# Altium schematic symbol library BARKO_SCHLIB.SchLib: 1064 symbols (part 10 of 11) (continued)
## R-69K8-0805 (continued)
RES 69.8K OHM 1% 1/8W 0805; Manufacturer 1: Stackpole Electronics; Manufacturer Part Number: RMCF0805FT69K8; Resistance: 69.8kR; Max Power Dissipation: 125mW; Temperature Coefficient: 100ppm/°C; .Creator: M.OZKAN; .PCBCHK: USED; Supplier 1: Digi-Key; Supplier Part Number 1: RMCF0805FT69K8CT-ND; RoHS: Yes; Category: Chip SMD Resistors; Stock: 4635; Pricing: 1=0,10000, 10=0,02600, 100=0,01040, 1000=0,00466, 2500=0,00405 (USD); Mount: Surface Mount; Case Code (Metric): 2012; Case Code (Imperial): 0805; Contact Plating: Tin,Matte; Min Operating Temperature: -55°C; Max Operating Temperature: 155°C; Features: Automotive AEC-Q200; Tolerance: 1%; Composition: Thick Film; Number of Terminations: 2; Packaging: Tape and Reel; Length: 0.079inch; Height: 0.026inch; Width: 0.049inch; Radiation Hardening: No; ComponentLink1URL: https://www.seielect.com/catalog/SEI-RMCF_RMCP.pdf?src-supplier=Avnet; ComponentLink1Description: https://www.seielect.com/catalog/SEI-RMCF_RMCP.pdf?src-supplier=Avnet; ComponentLink2URL: https://www.seielect.com/catalog/SEI-Packaging.pdf?src-supplier=Digi-Key; ComponentLink2Description: https://www.seielect.com/catalog/SEI-Packaging.pdf?src-supplier=Digi-Key; ComponentLink3URL: https://www.seielect.com/Catalog/SEI-RMCF_RMCP.pdf?src-supplier=Digi-Key; ComponentLink3Description: https://www.seielect.com/Catalog/SEI-RMCF_RMCP.pdf?src-supplier=Digi-Key; .SCHCHK: USED
footprint R-0805
pins: 1, 2

## R-75K-0603
designator R?, comment 75K  Case/Package: 0603
RES 100K OHM 1% 1/10W 0603; Manufacturer: Stackpole Electronics; Manufacturer Part Number: RMCF0603FT100K; Resistance: 100kR; Temperature Coefficient: 100ppm/°C; Max Power Dissipation: 100mW; Working Voltage: 75V; Washability: OK; .Creator: M.OZKAN; .PCBCHK: USED; Supplier 1: Digi-Key; Supplier Part Number 1: RMCF0603FT100KCT-ND; Stock 1: 1975649; Pricing 1: 1=0.10000, 10=0.01600, 100=0.00650, 1000=0.00292, 2500=0.00253 (USD); RoHS: Yes; Mount: Surface Mount; Case Code (Metric): 1608; Contact Plating: Tin,Matte; Case Code (Imperial): 0603; Min Operating Temperature: -55°C; Max Operating Temperature: 155°C; Tolerance: 1%; Packaging: Tape and Reel; Composition: Thick Film; Number of Terminations: 2; Features: Automotive AEC-Q200; Military Standard: Not; Power Rating: 100mW; Length: 1.55mm; Height: 0.022inch; Width: 0.031inch; Depth: 0.8mm; Radiation Hardening: No; Lead Free: Lead Free; ComponentLink1URL: https://datasheet.ciiva.com/15193/getdatasheetpartid-362597-15193437.pdf?src-supplier=Verical; ComponentLink1Description: https://datasheet.ciiva.com/15193/getdatasheetpartid-362597-15193437.pdf?src-supplier=Verical; .SCHCHK: USED
footprint R-0603
pins: 1, 2

## R-75R-0402
designator R?, comment 75R  Case Code (Imperial): 0402
RES SMD 75 OHM 1% 1/10W 0402; Manufacturer: Panasonic; Manufacturer Part Number: ERJ-2RKF75R0X; Voltage Rating: 50V; Power Rating: 100mW; Temperature Coefficient: 100ppm/°C; .PCBCHK: USED; .Creator: F:TALI; Washability: OK; Stock 1: 2772559; Pricing 1: 1=0.1, 10=0.045, 100=0.0183, 1000=0.00823, 2500=0.00715, 5000=0.0059 (USD); Mount: Surface Mount; Case/Package: 0402; Case Code (Metric): 1005; Contact Plating: Tin; Min Operating Temperature: -55°C; Max Operating Temperature: 155°C; Tolerance: 1%; Packaging: Tape and Reel; Resistance: 75R; Package Quantity: 1; Composition: Thick Film; Number of Terminations: 2; Termination: SMD/SMT; Military Standard: Not; Max Power Dissipation: 100mW; Voltage Rating (DC): 50V; Features: Automotive AEC-Q200; Length: 1mm; Height: 0.35mm; Width: 0.02inch; Depth: 0.5mm; Radiation Hardening: No; REACH SVHC: No SVHC; Lead Free: Lead Free; ComponentLink1URL: https://industrial.panasonic.com/cdbs/www-data/pdf/RDA0000/DMA0000COL11.pdf; ComponentLink1Description: https://industrial.panasonic.com/cdbs/www-data/pdf/RDA0000/DMA0000COL11.pdf; ComponentLink2URL: http://www.farnell.com/datasheets/1911175.pdf; ComponentLink2Description: http://www.farnell.com/datasheets/1911175.pdf; ComponentLink3URL: http://www.alliedelec.com/m/d/623f45ff1957d936ff56d46fd1c28cac.pdf; ComponentLink3Description: http://www.alliedelec.com/m/d/623f45ff1957d936ff56d46fd1c28cac.pdf; ComponentLink4URL: http://industrial.panasonic.com/www-data/pdf/AOA0000/AOA0000CE2.pdf; ComponentLink4Description: http://industrial.panasonic.com/www-data/pdf/AOA0000/AOA0000CE2.pdf; ComponentLink5URL: http://www.mouser.com/ds/2/315/AOA0000CE2-37512.pdf; ComponentLink5Description: http://www.mouser.com/ds/2/315/AOA0000CE2-37512.pdf; ComponentLink6URL: http://www.farnell.com/datasheets/426256.pdf; ComponentLink6Description: http://www.farnell.com/datasheets/426256.pdf; Stock 2: 926909; Pricing 2: 1=0.1, 10=0.031, 100=0.0125, 1000=0.0056, 2500=0.00486, 5000=0.00401 (USD); ComponentLink7URL: http://www.farnell.com/datasheets/2059623.pdf; ComponentLink7Description: http://www.farnell.com/datasheets/2059623.pdf; ComponentLink8URL: http://industrial.panasonic.com/www-data/pdf/AOA0000/AOA0000CE1.pdf; ComponentLink8Description: http://industrial.panasonic.com/www-data/pdf/AOA0000/AOA0000CE1.pdf; ComponentLink9URL: http://www.alliedelec.com/m/d/51cd0790071e1666bdb9d00c57fcf960.pdf; ComponentLink9Description: http://www.alliedelec.com/m/d/51cd0790071e1666bdb9d00c57fcf960.pdf; ComponentLink10URL: http://www.mouser.com/ds/2/315/AOA0000C84-947596.pdf; ComponentLink10Description: http://www.mouser.com/ds/2/315/AOA0000C84-947596.pdf; ComponentLink11URL: https://www.alliedelec.com/m/d/51cd0790071e1666bdb9d00c57fcf960.pdf; ComponentLink11Description: https://www.alliedelec.com/m/d/51cd0790071e1666bdb9d00c57fcf960.pdf; ComponentLink12URL: http://www.farnell.com/datasheets/1500035.pdf; ComponentLink12Description: http://www.farnell.com/datasheets/1500035.pdf; ComponentLink13URL: http://www.farnell.com/datasheets/1678796.pdf; ComponentLink13Description: http://www.farnell.com/datasheets/1678796.pdf; Stock 3: 153680; Pricing 3: 1=0.1, 10=0.016, 100=0.0064, 1000=0.00289, 2500=0.0025, 5000=0.00207 (USD); .SCHCHK: USED; Supplier 1: Digi-Key; Supplier Part Number 1: RMCF0402FT75R0DKR-ND
footprint R-0402
pins: 1, 2

## R-75R-0603
designator R?, comment 75R  Case Code (Imperial): 0603
RES SMD 75 OHM 1% 1/10W 0603; Manufacturer: Stackpole Electronics; Manufacturer Part Number: RMCF0603FT75R0; Max Power Dissipation: 100mW; Temperature Coefficient: 100ppm/°C; Washability: OK; .Creator: M.OZKAN; .PCBCHK: USED; Supplier 1: Digi-Key; Stock 1: 169664; Pricing 1: 1=0,10000, 10=0,01600, 100=0,00650, 1000=0,00292, 2500=0,00253 (USD); RoHS: Yes; Mount: Surface Mount; Case/Package: 0603; Case Code (Metric): 1608; Contact Plating: Tin,Matte; Min Operating Temperature: -55°C; Max Operating Temperature: 155°C; Packaging: Tape and Reel; Resistance: 75R; Tolerance: 1%; Composition: Thick Film; Number of Terminations: 2; Military Standard: Not; Features: Automotive AEC-Q200; Length: 0.061inch; Height: 0.022inch; Width: 0.031inch; Depth: 0.8mm; Radiation Hardening: No; ComponentLink1URL: https://datasheet.ciiva.com/15193/getdatasheetpartid-701591-15193493.pdf?src-supplier=Verical; ComponentLink1Description: https://datasheet.ciiva.com/15193/getdatasheetpartid-701591-15193493.pdf?src-supplier=Verical; Supplier Part Number 1: RMCF0603FT75R0CT-ND; .SCHCHK: USED
footprint R-0603
pins: 1, 2

## R-75R-0805
designator R?, comment 75R  Case/Package: 0805
RES SMD 75 OHM 1% 1/4W 0805; Manufacturer 1: Stackpole Electronics; Manufacturer Part Number: RNCP0805FTD75R0; Max Power Dissipation: 250mW; Temperature Coefficient: 100ppm/°C; .Creator: M.OZKAN; .PCBCHK: USED; Supplier 1: Digi-Key; RoHS: Yes; Category: Chip SMD Resistors; Stock: 48059; Pricing: 1=0,10000, 10=0,06900, 100=0,02640, 1000=0,01162, 2500=0,01003 (USD); Mount: Surface Mount; Case Code (Metric): 2012; Case Code (Imperial): 0805; Min Operating Temperature: -55°C; Max Operating Temperature: 155°C; Packaging: Tape and Reel; Composition: Thin Film; Number of Terminations: 2; Resistance: 75R; Features: Moisture Resistant,Anti-Sulfur; Tolerance: 1%; Length: 0.079inch; Height: 0.024inch; Width: 0.049inch; ComponentLink1URL: https://www.seielect.com/catalog/SEI-Packaging.pdf?src-supplier=Digi-Key; ComponentLink1Description: https://www.seielect.com/catalog/SEI-Packaging.pdf?src-supplier=Digi-Key; ComponentLink2URL: http://www.seielect.com/Catalog/SEI-rncp.pdf?src-supplier=Digi-Key; ComponentLink2Description: http://www.seielect.com/Catalog/SEI-rncp.pdf?src-supplier=Digi-Key; Supplier Part Number 1: RNCP0805FTD75R0CT-ND; .SCHCHK: USED
footprint R-0805
pins: 1, 2

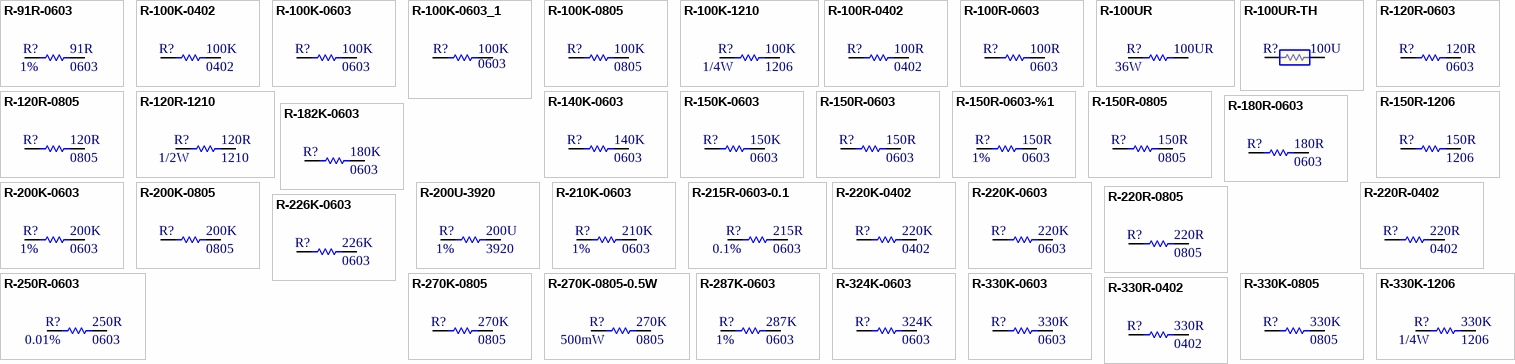
[diagram p39: symbols R-91R-0603 to R-330R-0402]

## R-91R-0603
designator R?, comment 91R  Tolerance: 1%  Case/Package: 0603
RES SMD 91 OHM 1% 1/10W 0603; Manufacturer: Yageo; Manufacturer Part Number: RC0603FR-0791RL; Power Rating: 100mW; Voltage Rating: 50V; Temperature Coefficient: 100ppm/°C; Washability: OK; .Creator: M.OZKAN; .PCBCHK: USED; ComponentLink1URL: https://www.seielect.com/Catalog/SEI-RMCF_RMCP.pdf?src-supplier=Digi-Key; ComponentLink1Description: https://www.seielect.com/Catalog/SEI-RMCF_RMCP.pdf?src-supplier=Digi-Key; ComponentLink2URL: https://www.seielect.com/catalog/SEI-Packaging.pdf?src-supplier=Digi-Key; ComponentLink2Description: https://www.seielect.com/catalog/SEI-Packaging.pdf?src-supplier=Digi-Key; ComponentLink3URL: https://www.seielect.com/catalog/SEI-RMCF_RMCP.pdf?src-supplier=Avnet; ComponentLink3Description: https://www.seielect.com/catalog/SEI-RMCF_RMCP.pdf?src-supplier=Avnet; Supplier 1: Digi-Key; Stock 1: 313164; Pricing 1: 1=0.10000, 10=0.02400, 100=0.00970, 1000=0.00437, 2500=0.00379 (USD); RoHS: Yes; Case Code (Imperial): 0603; Case Code (Metric): 1608; Min Operating Temperature: -55°C; Max Operating Temperature: 155°C; Packaging: Tape and Reel; Resistance: 91R; Package Quantity: 1; Termination: SMD/SMT; Composition: Thick Film; Number of Terminations: 2; Military Standard: Not; Max Power Dissipation: 100mW; Voltage Rating (DC): 50V; Features: Moisture Resistant; Length: 1.6mm; Height: 0.022inch; Width: 0.8mm; Depth: 0.8mm; Lead Free: Lead Free; ComponentLink4URL: https://datasheet.ciiva.com/2455/pyu-r-int-thick-7-2455335.pdf?src-supplier=Digi-Key; ComponentLink4Description: https://datasheet.ciiva.com/2455/pyu-r-int-thick-7-2455335.pdf?src-supplier=Digi-Key; ComponentLink5URL: https://datasheet.ciiva.com/2455/pyu-r-int-thick-7-2455336.pdf?src-supplier=Digi-Key; ComponentLink5Description: https://datasheet.ciiva.com/2455/pyu-r-int-thick-7-2455336.pdf?src-supplier=Digi-Key; ComponentLink6URL: https://datasheet.ciiva.com/2455/pyu-r-int-thick-7-2455337.pdf?src-supplier=Digi-Key; ComponentLink6Description: https://datasheet.ciiva.com/2455/pyu-r-int-thick-7-2455337.pdf?src-supplier=Digi-Key; Supplier Part Number 1: 311-91.0HRCT-ND; .SCHCHK: USED
footprint R-0603
pins: 1, 2

## R-100K-0402
designator R?, comment 100K  Case Code (Imperial): 0402
RES SMD 100K OHM 1% 1/16W 0402; Manufacturer: Vishay; Manufacturer Part Number: CRCW0402100KFKEDC; Power Rating: 62.5mW; Resistance: 100kR; Temperature Coefficient: 100ppm/°C; Voltage Rating: 50V; Max Power Dissipation: 100mW; .PCBCHK: USED; .Creator: F:TALI; Washability: OK; ComponentLink1URL: http://www.vishay.com/docs/28705/mcx0x0xpro.pdf; ComponentLink1Description: http://www.vishay.com/docs/28705/mcx0x0xpro.pdf; ComponentLink2URL: http://www.vishay.com/docs/28705/mc_pro.pdf; ComponentLink2Description: http://www.vishay.com/docs/28705/mc_pro.pdf; ComponentLink3URL: http://industrial.panasonic.com/www-data/pdf/AOA0000/AOA0000CE2.pdf; ComponentLink3Description: http://industrial.panasonic.com/www-data/pdf/AOA0000/AOA0000CE2.pdf; ComponentLink4URL: https://industrial.panasonic.com/cdbs/www-data/pdf/RDA0000/DMA0000COL11.pdf; ComponentLink4Description: https://industrial.panasonic.com/cdbs/www-data/pdf/RDA0000/DMA0000COL11.pdf; ComponentLink5URL: http://www.farnell.com/datasheets/1911175.pdf; ComponentLink5Description: http://www.farnell.com/datasheets/1911175.pdf; ComponentLink6URL: http://www.alliedelec.com/m/d/623f45ff1957d936ff56d46fd1c28cac.pdf; ComponentLink6Description: http://www.alliedelec.com/m/d/623f45ff1957d936ff56d46fd1c28cac.pdf; ComponentLink7URL: http://www.farnell.com/datasheets/426256.pdf; ComponentLink7Description: http://www.farnell.com/datasheets/426256.pdf; ComponentLink8URL: http://www.jameco.com/Jameco/Products/ProdDS/1987038.pdf; ComponentLink8Description: http://www.jameco.com/Jameco/Products/ProdDS/1987038.pdf; ComponentLink9URL: http://www.vishay.com/docs/20043/crcwhpe3.pdf; ComponentLink9Description: http://www.vishay.com/docs/20043/crcwhpe3.pdf; ComponentLink10URL: http://www.mouser.com/ds/2/427/crcwhpe3-46056.pdf; ComponentLink10Description: http://www.mouser.com/ds/2/427/crcwhpe3-46056.pdf; Stock 1: 1625728; Pricing 1: 1=0.1, 10=0.026, 100=0.0104, 1000=0.00466, 2500=0.00405, 5000=0.00334 (USD); Mount: Surface Mount; Case/Package: SMD/SMT; Contact Plating: Tin; Min Operating Temperature: -55°C; Max Operating Temperature: 155°C; Tolerance: 1%; Composition: Thick Film; Termination: Wraparound; Length: 1mm; Lead Free: Lead Free; Stock 2: 0; Pricing 2: 1=0.3, 10=0.254, 100=0.0993, 1000=0.04158, 2500=0.03812, 5000=0.03465 (USD); Weight: 2.1E-05oz; Case Code (Metric): 1005; Package Quantity: 1; Packaging: Tape and Reel; Number of Terminations: 2; Military Standard: Not; Voltage Rating (DC): 50V; Height: 0.015inch; Width: 0.02inch; Depth: 0.5mm; Radiation Hardening: No; REACH SVHC: No SVHC; .SCHCHK: USED; Supplier 1: Digi-Key; Supplier Part Number 1: 541-3960-6-ND
footprint R-0402
pins: 1, 2

## R-100K-0603
designator R?, comment 100K  Case Code (Imperial): 0603
RES SMD 100K OHM 5% 1/10W 0603; Manufacturer: YAGEO; Manufacturer Part Number: RC0603JR-10100KL; Resistance: 100kR; Temperature Coefficient: 100ppm/°C; Power Rating: 100mW; Voltage Rating: 50V; Working Voltage: 75V; Number of Resistors: 1; .PCBCHK: USED; .Creator: F:TALI; Washability: OK; Stock 1: 0; Pricing 1: 1=0.1, 10=0.022, 100=0.0088, 1000=0.00396, 2500=0.00344, 5000=0.00284 (USD); Case/Package: 0603; Number of Pins: 2; Contact Plating: Matte,Tin; Case Code (Metric): 1608; Min Operating Temperature: -55°C; Max Operating Temperature: 155°C; Tolerance: 5%; Composition: Thick Film; Packaging: Tape and Reel; Number of Terminations: 2; Termination: SMD/SMT; Package Quantity: 10000; Military Standard: Not; Max Power Dissipation: 100mW; Voltage Rating (DC): 50V; Features: Moisture Resistant; Length: 1.6mm; Height: 0.022inch; Width: 0.031inch; Depth: 0.8mm; Radiation Hardening: No; REACH SVHC: No SVHC; ComponentLink1URL: http://www.mouser.com/ds/2/447/RC0603-272842.pdf; ComponentLink1Description: http://www.mouser.com/ds/2/447/RC0603-272842.pdf; ComponentLink2URL: https://www.verical.com/server-webapp/html/getDatasheet?partID=326545; ComponentLink2Description: https://www.verical.com/server-webapp/html/getDatasheet?partID=326545; Lead Free: Lead Free; ComponentLink3URL: http://www.farnell.com/datasheets/2167052.pdf; ComponentLink3Description: http://www.farnell.com/datasheets/2167052.pdf; ComponentLink4URL: http://www.farnell.com/datasheets/1868787.pdf; ComponentLink4Description: http://www.farnell.com/datasheets/1868787.pdf; ComponentLink5URL: http://www.farnell.com/datasheets/1738695.pdf; ComponentLink5Description: http://www.farnell.com/datasheets/1738695.pdf; ComponentLink6URL: http://documents.rs-components.com/techlib://itc_doclist_GB.htm?stockno=5048940; ComponentLink6Description: http://documents.rs-components.com/techlib://itc_doclist_GB.htm?stockno=5048940; ComponentLink7URL: http://www.farnell.com/datasheets/443971.pdf; ComponentLink7Description: http://www.farnell.com/datasheets/443971.pdf; Mount: Surface Mount; Weight: 7.1E-05oz; ComponentLink8URL: http://industrial.panasonic.com/www-data/pdf/AOA0000/AOA0000CE2.pdf; ComponentLink8Description: http://industrial.panasonic.com/www-data/pdf/AOA0000/AOA0000CE2.pdf; ComponentLink9URL: https://www.verical.com/server-webapp/html/getDatasheet?partID=247527; ComponentLink9Description: https://www.verical.com/server-webapp/html/getDatasheet?partID=247527; ComponentLink10URL: http://www.alliedelec.com/m/d/623f45ff1957d936ff56d46fd1c28cac.pdf; ComponentLink10Description: http://www.alliedelec.com/m/d/623f45ff1957d936ff56d46fd1c28cac.pdf; ComponentLink11URL: http://www.jameco.com/Jameco/Products/ProdDS/1987476.pdf; ComponentLink11Description: http://www.jameco.com/Jameco/Products/ProdDS/1987476.pdf; Stock 2: 0; Pricing 2: 5000=0.0033, 10000=0.00287, 25000=0.00252, 50000=0.00231, 125000=0.00229 (USD); ComponentLink12URL: http://www1.futureelectronics.com/doc/SAMSUNG/RCSERIES.pdf; ComponentLink12Description: http://www1.futureelectronics.com/doc/SAMSUNG/RCSERIES.pdf; Failure Rate: 0.01%; ComponentLink13URL: http://www.vishay.com/docs/31010/rcwpm.pdf; ComponentLink13Description: http://www.vishay.com/docs/31010/rcwpm.pdf; ComponentLink14URL: http://www.yageo.com/documents/recent/PYu-RC_Group_51_RoHS_L_9.pdf; ComponentLink14Description: http://www.yageo.com/documents/recent/PYu-RC_Group_51_RoHS_L_9.pdf; ComponentLink15URL: https://www.verical.com/server-webapp/html/getDatasheet?partID=327958; ComponentLink15Description: https://www.verical.com/server-webapp/html/getDatasheet?partID=327958; ComponentLink16URL: http://www.yageo.com/documents/recent/PYu-RC_Group_51_RoHS_L_2.pdf; ComponentLink16Description: http://www.yageo.com/documents/recent/PYu-RC_Group_51_RoHS_L_2.pdf; ComponentLink17URL: http://www.yageo.com/NewPortal/yageodocoutput?fileName=/pdf/R-Chip/PYu-RT_1-to-0.05_RoHS_L_5.pdf; ComponentLink17Description: http://www.yageo.com/NewPortal/yageodocoutput?fileName=/pdf/R-Chip/PYu-RT_1-to-0.05_RoHS_L_5.pdf; Lead Pitch: 0.4mm; ComponentLink18URL: http://documents.rs-components.com/techlib://itc_doclist_GB.htm?stockno=6185113; ComponentLink18Description: http://documents.rs-components.com/techlib://itc_doclist_GB.htm?stockno=6185113; ComponentLink19URL: http://www.yageo.ru/pdf/RC0805.pdf; ComponentLink19Description: http://www.yageo.ru/pdf/RC0805.pdf; ComponentLink20URL: http://www.farnell.com/datasheets/38627.pdf; ComponentLink20Description: http://www.farnell.com/datasheets/38627.pdf; ComponentLink21URL: http://www.farnell.com/datasheets/1697719.pdf; ComponentLink21Description: http://www.farnell.com/datasheets/1697719.pdf; ComponentLink22URL: http://www.farnell.com/datasheets/1686128.pdf; ComponentLink22Description: http://www.farnell.com/datasheets/1686128.pdf; ComponentLink23URL: http://www.farnell.com/datasheets/444164.pdf; ComponentLink23Description: http://www.farnell.com/datasheets/444164.pdf; Stock 3: 219997; Pricing 3: 1=0.1, 10=0.026, 100=0.0104, 1000=0.00469, 2500=0.00407 (USD); ELV: Compliant; ComponentLink24URL: http://www.alliedelec.com/m/d/dd92310293d361ca5b4f9a8a31ebf2ac.pdf; ComponentLink24Description: http://www.alliedelec.com/m/d/dd92310293d361ca5b4f9a8a31ebf2ac.pdf; ComponentLink25URL: http://www.mouser.com/ds/2/418/NG_CD_1622827_BA-655491.pdf; ComponentLink25Description: http://www.mouser.com/ds/2/418/NG_CD_1622827_BA-655491.pdf; ComponentLink26URL: http://uk.rs-online.com/webdocs/13d1/0900766b813d116f.pdf; ComponentLink26Description: http://uk.rs-online.com/webdocs/13d1/0900766b813d116f.pdf; Stock 4: 9351077; Pricing 4: 1=0.1, 10=0.065, 100=0.0264, 1000=0.01186, 2500=0.01029 (USD); Stock 5: 0; Pricing 5: 1=0.25, 10=0.211, 25=0.1532, 50=0.111, 100=0.0823, 250=0.06316, 500=0.04976, 1000=0.03445 (USD); Height - Seated (Max): 0.022inch; Stock 6: 227219; Pricing 6: 1=0.1, 10=0.016, 100=0.0064, 1000=0.00289, 2500=0.0025 (USD); ComponentLink27URL: https://www.verical.com/server-webapp/html/getDatasheet?partID=359906; ComponentLink27Description: https://www.verical.com/server-webapp/html/getDatasheet?partID=359906; Stock 7: 0; ComponentLink28URL: http://datasheet.octopart.com/0603SAJ0104T5E-Royal-Ohm-datasheet-17591902.pdf; ComponentLink28Description: http://datasheet.octopart.com/0603SAJ0104T5E-Royal-Ohm-datasheet-17591902.pdf; ComponentLink29URL: http://datasheet.octopart.com/0603SAJ0104T5E-Royal-Ohm-datasheet-62069544.pdf; ComponentLink29Description: http://datasheet.octopart.com/0603SAJ0104T5E-Royal-Ohm-datasheet-62069544.pdf; ComponentLink30URL: http://datasheet.octopart.com/0603SAJ0104T5E-Royal-Electronics-datasheet-17591902.pdf; ComponentLink30Description: http://datasheet.octopart.com/0603SAJ0104T5E-Royal-Electronics-datasheet-17591902.pdf; Stock 8: 1000; Pricing 8: 1=0.1, 10=0.028, 100=0.0113, 1000=0.00507, 2500=0.0044 (USD); .SCHCHK: USED; Supplier 1: Digi-Key; Supplier Part Number 1: YAG2294DKR-ND
footprint R-0603
pins: 1, 2

## R-100K-0603_1
designator R?, comment 100K  Case/Package: 0603
RES 100K OHM 1% 1/10W 0603; Manufacturer: Stackpole Electronics; Manufacturer Part Number: RMCF0603FT100K; Resistance: 100kR; Power Rating: 100mW; Temperature Coefficient: 100ppm/°C; Working Voltage: 75V; Washability: OK; .Creator: M.OZKAN; .PCBCHK: USED; Supplier 1: Digi-Key; Stock 1: 2295691; Pricing 1: 1=0.10000, 10=0.01700, 100=0.00680, 1000=0.00306, 2500=0.00266 (USD); RoHS: Yes; Mount: Surface Mount; Case Code (Metric): 1608; Case Code (Imperial): 0603; Contact Plating: Tin; Min Operating Temperature: -55°C; Max Operating Temperature: 155°C; Tolerance: 1%; Packaging: Tape and Reel; Composition: Thick Film; Number of Terminations: 2; Military Standard: Not; Max Power Dissipation: 100mW; Features: Automotive AEC-Q200; Length: 1.55mm; Height: 0.022inch; Width: 0.031inch; Depth: 0.8mm; Radiation Hardening: No; Lead Free: Lead Free; ComponentLink1URL: https://datasheet.ciiva.com/15193/getdatasheetpartid-362597-15193437.pdf?src-supplier=Verical; ComponentLink1Description: https://datasheet.ciiva.com/15193/getdatasheetpartid-362597-15193437.pdf?src-supplier=Verical; Supplier Part Number 1: RMCF0603FT100KCT-ND; .SCHCHK: USED
footprint R-0603
pins: 1, 2

## R-100K-0805
designator R?, comment 100K  Case Code (Imperial): 0805
RES SMD 100K OHM 1% 1/8W 0805; Manufacturer: Yageo; Manufacturer Part Number: RC0805FR-07100KL; Resistance: 100kR; Temperature Coefficient: 100ppm/°C; Voltage Rating (DC): 150V; Power Rating: 125mW; .PCBCHK: USED; .Creator: F:TALI; Washability: OK; Stock 1: 11814302; Pricing 1: 1=0.1, 10=0.046, 100=0.0186, 1000=0.00835, 2500=0.00725 (USD); Case/Package: 0805; Number of Pins: 2; Case Code (Metric): 2012; Min Operating Temperature: -55°C; Max Operating Temperature: 155°C; Tolerance: 1%; Composition: Thick Film; Packaging: Tape and Reel; Voltage Rating: 150V; Package Quantity: 1; Number of Terminations: 2; Termination: SMD/SMT; Military Standard: Not; Max Power Dissipation: 125mW; Features: Moisture Resistant; Length: 2mm; Height: 0.024inch; Width: 0.049inch; Depth: 1.25mm; Lead Pitch: 0.4mm; REACH SVHC: Unknown; Lead Free: Lead Free; ComponentLink1URL: http://www.yageo.com/documents/recent/PYu-RC_Group_51_RoHS_L_9.pdf; ComponentLink1Description: http://www.yageo.com/documents/recent/PYu-RC_Group_51_RoHS_L_9.pdf; ComponentLink2URL: http://documents.rs-components.com/techlib://itc_doclist_GB.htm?stockno=6185113; ComponentLink2Description: http://documents.rs-components.com/techlib://itc_doclist_GB.htm?stockno=6185113; ComponentLink3URL: http://www.yageo.ru/pdf/RC0805.pdf; ComponentLink3Description: http://www.yageo.ru/pdf/RC0805.pdf; ComponentLink4URL: http://www.farnell.com/datasheets/38627.pdf; ComponentLink4Description: http://www.farnell.com/datasheets/38627.pdf; ComponentLink5URL: http://www.farnell.com/datasheets/1697719.pdf; ComponentLink5Description: http://www.farnell.com/datasheets/1697719.pdf; ComponentLink6URL: http://www.farnell.com/datasheets/1686128.pdf; ComponentLink6Description: http://www.farnell.com/datasheets/1686128.pdf; ComponentLink7URL: http://www.farnell.com/datasheets/444164.pdf; ComponentLink7Description: http://www.farnell.com/datasheets/444164.pdf; Contact Plating: Matte,Tin; Radiation Hardening: No; Mount: Surface Mount; Stock 2: 0; Pricing 2: 1=0.1, 10=0.039, 100=0.0159, 1000=0.00716, 2500=0.00622 (USD); ComponentLink8URL: http://www.farnell.com/datasheets/442941.pdf; ComponentLink8Description: http://www.farnell.com/datasheets/442941.pdf; ComponentLink9URL: https://www.verical.com/server-webapp/html/getDatasheet?partID=479267; ComponentLink9Description: https://www.verical.com/server-webapp/html/getDatasheet?partID=479267; Stock 3: 89260; Pricing 3: 1=0.1, 10=0.061, 100=0.0249, 1000=0.0112, 2500=0.00972 (USD); Weight: 0.000194oz; ComponentLink10URL: https://www.alliedelec.com/m/d/51cd0790071e1666bdb9d00c57fcf960.pdf; ComponentLink10Description: https://www.alliedelec.com/m/d/51cd0790071e1666bdb9d00c57fcf960.pdf; ComponentLink11URL: http://www.farnell.com/datasheets/2371628.pdf; ComponentLink11Description: http://www.farnell.com/datasheets/2371628.pdf; ComponentLink12URL: http://www.farnell.com/datasheets/2059623.pdf; ComponentLink12Description: http://www.farnell.com/datasheets/2059623.pdf; ComponentLink13URL: http://industrial.panasonic.com/www-data/pdf/AOA0000/AOA0000CE1.pdf; ComponentLink13Description: http://industrial.panasonic.com/www-data/pdf/AOA0000/AOA0000CE1.pdf; ComponentLink14URL: http://www.jameco.com/Jameco/Products/ProdDS/2007290.pdf; ComponentLink14Description: http://www.jameco.com/Jameco/Products/ProdDS/2007290.pdf; ComponentLink15URL: http://www.farnell.com/datasheets/1500035.pdf; ComponentLink15Description: http://www.farnell.com/datasheets/1500035.pdf; ComponentLink16URL: http://www.mouser.com/ds/2/447/RC0805-257173.pdf; ComponentLink16Description: http://www.mouser.com/ds/2/447/RC0805-257173.pdf; .SCHCHK: USED; Supplier 1: Digi-Key; Supplier Part Number 1: 311-100KCRDKR-ND
footprint R-0805
pins: 1, 2

## R-100K-1210
designator R?, comment 100K  Power Rating: 1/4W  Case Code (Imperial): 1206
RES SMD 100K OHM 1/4W 1% 1206; Manufacturer: Yageo; Manufacturer Part Number: RC1206FR-07100KL; Resistance: 100kR; Temperature Coefficient: 100ppm/°C; Voltage Rating: 200V; .PCBCHK: USED; .Creator: F:TALI; Washability: OK; Supplier 1: Digi-Key; Supplier Part Number 1: 311-100KFRCT-ND; Stock 1: 3461023; Pricing 1: 1=0.1, 10=0.081, 100=0.0331, 1000=0.01487, 2500=0.01291 (USD); Case/Package: 1206; Case Code (Metric): 3216; Min Operating Temperature: -55°C; Max Operating Temperature: 155°C; Tolerance: 1%; Packaging: Tape and Reel; Composition: Thick Film; Termination: SMD/SMT; Length: 3.1mm; Height: 0.55mm; Depth: 1.6mm; REACH SVHC: No SVHC; Lead Free: Lead Free; ComponentLink1URL: http://www.farnell.com/datasheets/444357.pdf; ComponentLink1Description: http://www.farnell.com/datasheets/444357.pdf; ComponentLink2URL: http://www.yageo.com/documents/recent/PYu-RC1206_51_RoHS_L-4.pdf; ComponentLink2Description: http://www.yageo.com/documents/recent/PYu-RC1206_51_RoHS_L-4.pdf; .SCHCHK: USED
footprint R-1210
pins: 1, 2

## R-100R-0402
designator R?, comment 100R  Case Code (Imperial): 0402
RES SMD 100 OHM 1% 1/16W 0402; Manufacturer: Vishay Dale; Manufacturer Part Number: CRCW0402100RFKED; Temperature Coefficient: 100ppm/°C; Power Rating: 63mW; Voltage Rating: 50V; .PCBCHK: USED; .Creator: F:TALI; Washability: OK; Stock 1: 388910; Pricing 1: 1=0.1, 10=0.044, 100=0.0178, 1000=0.00802, 2500=0.00696, 5000=0.00575 (USD); Mount: Surface Mount; Case/Package: 0402; Weight: 2.3E-05oz; Contact Plating: Tin; Case Code (Metric): 1005; Min Operating Temperature: -55°C; Max Operating Temperature: 155°C; Resistance: 100R; Tolerance: 1%; Composition: Thick Film; Termination: SMD/SMT; Packaging: Tape and Reel; Package Quantity: 10; Voltage Rating (DC): 50V; Number of Terminations: 2; Military Standard: Not; Max Power Dissipation: 63mW; Features: Automotive AEC-Q200; Working Voltage: 50V; Length: 1mm; Height: 0.35mm; Width: 0.02inch; Depth: 0.5mm; Radiation Hardening: No; Lead Free: Lead Free; REACH SVHC: Unknown; ComponentLink1URL: http://www.vishay.com/docs/20035/dcrcwe3.pdf; ComponentLink1Description: http://www.vishay.com/docs/20035/dcrcwe3.pdf; ComponentLink2URL: http://www.mouser.com/ds/2/427/dcrcwe3-109170.pdf; ComponentLink2Description: http://www.mouser.com/ds/2/427/dcrcwe3-109170.pdf; ComponentLink3URL: http://uk.rs-online.com/webdocs/13ec/0900766b813ecbdf.pdf; ComponentLink3Description: http://uk.rs-online.com/webdocs/13ec/0900766b813ecbdf.pdf; ComponentLink4URL: http://www.alliedelec.com/m/d/0c934d6939ccefa68dbe0b96d821c8cf.pdf; ComponentLink4Description: http://www.alliedelec.com/m/d/0c934d6939ccefa68dbe0b96d821c8cf.pdf; ComponentLink5URL: http://www.farnell.com/datasheets/2111203.pdf; ComponentLink5Description: http://www.farnell.com/datasheets/2111203.pdf; ComponentLink6URL: http://www.farnell.com/datasheets/2045673.pdf; ComponentLink6Description: http://www.farnell.com/datasheets/2045673.pdf; Number of Pins: 2; ComponentLink7URL: http://www.farnell.com/datasheets/1784430.pdf; ComponentLink7Description: http://www.farnell.com/datasheets/1784430.pdf; ComponentLink8URL: http://www.yageo.com/documents/recent/PYu-RC_Group_51_RoHS_L_9.pdf; ComponentLink8Description: http://www.yageo.com/documents/recent/PYu-RC_Group_51_RoHS_L_9.pdf; ComponentLink9URL: http://www.yageo.com/documents/recent/PYu-RC0402_51_RoHS_L_6_r.pdf; ComponentLink9Description: http://www.yageo.com/documents/recent/PYu-RC0402_51_RoHS_L_6_r.pdf; ComponentLink10URL: https://www.verical.com/server-webapp/html/getDatasheet?partID=329466; ComponentLink10Description: https://www.verical.com/server-webapp/html/getDatasheet?partID=329466; ComponentLink11URL: http://www.farnell.com/datasheets/1018594.pdf; ComponentLink11Description: http://www.farnell.com/datasheets/1018594.pdf; ComponentLink12URL: http://documents.rs-components.com/techlib://itc_doclist_GB.htm?stockno=6185810; ComponentLink12Description: http://documents.rs-components.com/techlib://itc_doclist_GB.htm?stockno=6185810; Stock 2: 10646; Pricing 2: 1=0.1, 10=0.076, 100=0.029, 1000=0.01278, 2500=0.01104, 5000=0.00987 (USD); ComponentLink13URL: http://www.yageo.com/documents/recent/PYu-RT_1-to-0.05_RoHS_L_6.pdf; ComponentLink13Description: http://www.yageo.com/documents/recent/PYu-RT_1-to-0.05_RoHS_L_6.pdf; ComponentLink14URL: http://www.mouser.com/ds/2/447/yageodocoutput-1125656.pdf; ComponentLink14Description: http://www.mouser.com/ds/2/447/yageodocoutput-1125656.pdf; Stock 3: 50000; Pricing 3: 10000=0.00174, 30000=0.00153, 50000=0.0014, 100000=0.00139 (USD); ComponentLink15URL: http://www.samsungsem.com/kr/support/product-search/chip-resistor/RC1005J101CS.jsp; ComponentLink15Description: http://www.samsungsem.com/kr/support/product-search/chip-resistor/RC1005J101CS.jsp; ComponentLink16URL: http://www1.futureelectronics.com/doc/SAMSUNG/RC.series.pdf; ComponentLink16Description: http://www1.futureelectronics.com/doc/SAMSUNG/RC.series.pdf; .SCHCHK: USED; Supplier 1: Digi-Key; Supplier Part Number 1: 541-100LCT-ND
footprint R-0402
pins: 1, 2

## R-100R-0603
designator R?, comment 100R  Case Code (Imperial): 0603
RES SMD 100 OHM 1% 1/8W 0603; Manufacturer: Stackpole Electronics; Manufacturer Part Number: RNCP0603FTD100R; Max Power Dissipation: 125mW; Temperature Coefficient: 100ppm/°C; Voltage Rating (DC): 50V; Power Rating: 100mW; Number of Resistors: 1; .PCBCHK: USED; .Creator: F:TALI; Washability: OK; Stock 1: 0; Pricing 1: 1=0.1, 10=0.067, 100=0.0273, 1000=0.01224, 2500=0.01063 (USD); Mount: Surface Mount; Case/Package: 0603; Case Code (Metric): 1608; Contact Plating: Matte,Tin; Min Operating Temperature: -55°C; Max Operating Temperature: 155°C; Resistance: 100R; Tolerance: 1%; Packaging: Tape and Reel; Composition: Thin Film; Number of Terminations: 2; Features: Anti-Sulfur,Moisture Resistant; Length: 0.059inch; Height: 0.02inch; Width: 0.031inch; Radiation Hardening: No; Lead Free: Lead Free; Stock 2: 30225949; Pricing 2: 1=0.1, 10=0.026, 100=0.0107, 1000=0.00478, 2500=0.00415 (USD); Number of Pins: 2; Voltage Rating: 50V; Termination: SMD/SMT; Military Standard: Not; Depth: 0.8mm; REACH SVHC: Unknown; ComponentLink1URL: http://www.farnell.com/datasheets/1868787.pdf; ComponentLink1Description: http://www.farnell.com/datasheets/1868787.pdf; ComponentLink2URL: http://documents.rs-components.com/techlib://itc_doclist_GB.htm?stockno=5048912; ComponentLink2Description: http://documents.rs-components.com/techlib://itc_doclist_GB.htm?stockno=5048912; ComponentLink3URL: http://www.farnell.com/datasheets/1686128.pdf; ComponentLink3Description: http://www.farnell.com/datasheets/1686128.pdf; ComponentLink4URL: http://www.farnell.com/datasheets/1738695.pdf; ComponentLink4Description: http://www.farnell.com/datasheets/1738695.pdf; ComponentLink5URL: http://www.farnell.com/datasheets/443971.pdf; ComponentLink5Description: http://www.farnell.com/datasheets/443971.pdf; Stock 3: 0; Weight: 7.1E-05oz; Package Quantity: 5000; ELV: Compliant; ComponentLink6URL: http://uk.rs-online.com/webdocs/1380/0900766b813807f7.pdf; ComponentLink6Description: http://uk.rs-online.com/webdocs/1380/0900766b813807f7.pdf; ComponentLink7URL: https://www.alliedelec.com/m/d/dd92310293d361ca5b4f9a8a31ebf2ac.pdf; ComponentLink7Description: https://www.alliedelec.com/m/d/dd92310293d361ca5b4f9a8a31ebf2ac.pdf; .SCHCHK: USED; Supplier 1: Digi-Key; Supplier Part Number 1: RNCP0603FTD100RDKR-ND
footprint R-0603
pins: 1, 2

## R-100UR
designator R?, comment 100UR  POWER: 36W
RESISTOR SHUNT 100 UOHM 5% 36W; Manufacturer: Vishay; Manufacturer Part Number: WSBS8518L1000JK14; .Creator: F:TALI; .PCBCHK: USED; Washability: OK; Stock 1: 52; Pricing 1: 1=10.71, 10=10.041, 25=9.3712, 50=8.2556, 100=7.14, 250=6.47064, 500=6.02438, 1000=5.57813 (USD); Stock 2: 63; Pricing 2: 1=10.2, 10=9.57, 50=7.87, 100=6.17, 1000=5.32, 10000=5.32 (USD); .SCHCHK: USED; Supplier 1: Digi-Key; Supplier Part Number 1: 541-3321-ND
footprint R-100UR
pins: 1, 2

## R-100UR-TH
designator R?, comment 100U
RESISTOR SHUNT 100 UOHM 5% 36W; Manufacturer: Vishay; Manufacturer Part Number: WSBS8518L1000JK20; Washability: OK; .Creator: M.OZKAN; .PCBCHK: USED; Supplier 1: Digi-Key; Stock 1: 0; Pricing 1: 1=12.71000, 10=11.55000, 25=10.39520, 50=8.95120, 100=8.22940, 250=7.79624, 500=7.50750, 1000=7.16100 (USD); RoHS: No; ComponentLink1URL: http://www.vishay.com/docs/30341/wsbs8518_20.pdf?src-supplier=Digi-Key; ComponentLink1Description: http://www.vishay.com/docs/30341/wsbs8518_20.pdf?src-supplier=Digi-Key; Supplier Part Number 1: 541-3323-ND; .SCHCHK: USED
footprint R-100U-TH
pins: 1, 2

## R-120R-0603
designator R?, comment 120R  Case Code (Imperial): 0603
RES SMD 120 OHM 1% 1/8W 0603; Manufacturer: Vishay Beyschlag; Manufacturer Part Number: MCT06030C1200FP500; Temperature Coefficient: 50ppm/°C; Power Rating: 125mW; Voltage Rating: 75V; .PCBCHK: USED; .Creator: F:TALI; Washability: OK; Supplier 1: Digi-Key; Supplier Part Number 1: MCT0603-120-CFDKR-ND; Stock 1: 14324; Pricing 1: 1=0.18, 10=0.152, 100=0.0596, 1000=0.02495, 2500=0.02287 (USD); Case/Package: 0603; Contact Plating: Tin; Case Code (Metric): 1608; Min Operating Temperature: -55°C; Max Operating Temperature: 125°C; Resistance: 120R; Tolerance: 1%; Composition: Thin Film; Package Quantity: 1; Packaging: Tape and Reel; Number of Terminations: 2; Military Standard: Not; Max Power Dissipation: 125mW; Voltage Rating (DC): 75V; Length: 0.061inch; Height: 0.022inch; Width: 0.033inch; Depth: 0.85mm; Radiation Hardening: No; REACH SVHC: No SVHC; Lead Free: Lead Free; ComponentLink1URL: http://www.vishay.com/docs/28705/mcx0x0xpro.pdf; ComponentLink1Description: http://www.vishay.com/docs/28705/mcx0x0xpro.pdf; ComponentLink2URL: http://www.vishay.com/docs/28705/mc_pro.pdf; ComponentLink2Description: http://www.vishay.com/docs/28705/mc_pro.pdf; .SCHCHK: USED
footprint R-0603
pins: 1, 2

## R-120R-0805
designator R?, comment 120R  Case Code (Imperial): 0805
RES SMD 120 OHM 5% 1/8W 0805; Manufacturer: Yageo; Manufacturer Part Number: RC0805JR-07120RL; Temperature Coefficient: 100ppm/°C; Power Rating: 125mW; Voltage Rating: 150V; Voltage Rating (DC): 75V; .PCBCHK: USED; .Creator: F:TALI; Washability: OK; Stock 1: 0; Pricing 1: 1=0.1, 10=0.039, 100=0.0159, 1000=0.00716, 2500=0.00622 (USD); Case/Package: 0805; Contact Plating: Lead,Matte,Tin; Case Code (Metric): 2012; Min Operating Temperature: -55°C; Max Operating Temperature: 155°C; Resistance: 120R; Tolerance: 5%; Composition: Thick Film; Packaging: Tape and Reel; Package Quantity: 1; Termination: SMD/SMT; Number of Terminations: 2; Military Standard: Not; Max Power Dissipation: 125mW; Features: Moisture Resistant; Length: 0.079inch; Height: 0.024inch; Width: 0.049inch; Depth: 1.25mm; Radiation Hardening: No; REACH SVHC: Unknown; Lead Free: Lead Free; ComponentLink1URL: http://www.farnell.com/datasheets/442941.pdf; ComponentLink1Description: http://www.farnell.com/datasheets/442941.pdf; ComponentLink2URL: http://www.yageo.com/documents/recent/PYu-RC_Group_51_RoHS_L_9.pdf; ComponentLink2Description: http://www.yageo.com/documents/recent/PYu-RC_Group_51_RoHS_L_9.pdf; ComponentLink3URL: http://www.yageo.ru/pdf/RC0805.pdf; ComponentLink3Description: http://www.yageo.ru/pdf/RC0805.pdf; ComponentLink4URL: http://www.vishay.com/docs/28705/mcx0x0xpro.pdf; ComponentLink4Description: http://www.vishay.com/docs/28705/mcx0x0xpro.pdf; ComponentLink5URL: http://www.vishay.com/docs/28705/mc_pro.pdf; ComponentLink5Description: http://www.vishay.com/docs/28705/mc_pro.pdf; Stock 2: 46428; Pricing 2: 1=0.1, 10=0.076, 100=0.029, 1000=0.01278, 2500=0.01104, 5000=0.00987 (USD); Mount: Surface Mount; Number of Pins: 2; Thickness: 508um; ComponentLink6URL: http://uk.rs-online.com/webdocs/0fcd/0900766b80fcdb72.pdf; ComponentLink6Description: http://uk.rs-online.com/webdocs/0fcd/0900766b80fcdb72.pdf; ComponentLink7URL: http://www.farnell.com/datasheets/1902866.pdf; ComponentLink7Description: http://www.farnell.com/datasheets/1902866.pdf; ComponentLink8URL: http://www.mouser.com/ds/2/54/chpreztr-977002.pdf; ComponentLink8Description: http://www.mouser.com/ds/2/54/chpreztr-977002.pdf; ComponentLink9URL: http://www.farnell.com/datasheets/1856384.pdf; ComponentLink9Description: http://www.farnell.com/datasheets/1856384.pdf; Stock 3: 374800; Pricing 3: 100=0.0149, 1000=0.0055, 5000=0.00312, 15000=0.0026, 50000=0.0023 (USD); .SCHCHK: USED; Supplier 1: Digi-Key; Supplier Part Number 1: 311-120ARDKR-ND
footprint R-0805
pins: 1, 2

## R-120R-1210
designator R?, comment 120R  Max Power Dissipation: 1/2W  Case/Package: 1210
RES SMD 120 OHM 1% 1/2W 1210; Manufacturer: Stackpole Electronics; Manufacturer Part Number: RMCF1210FT120R; Temperature Coefficient: 100ppm/°C; Power Rating: 500mW; Voltage Rating: 200V; .PCBCHK: USED; .Creator: F:TALI; Washability: OK; Stock 1: 3547; Pricing 1: 1=0.16, 10=0.133, 100=0.052, 1000=0.02178 (USD); Mount: Surface Mount; Contact Plating: Matte,Tin; Min Operating Temperature: -55°C; Max Operating Temperature: 155°C; Packaging: Tape and Reel; Resistance: 120R; Tolerance: 1%; Package Quantity: 4000; Composition: Thick Film; Number of Terminations: 2; Features: Automotive AEC-Q200; Length: 0.126inch; Height: 0.028inch; Width: 0.098inch; Radiation Hardening: No; Stock 2: 38845; Weight: 0.000564oz; Case Code (Metric): 3225; Case Code (Imperial): 1210; Termination: SMD/SMT; Military Standard: Not; Voltage Rating (DC): 200V; Depth: 2.5mm; Lead Free: Lead Free; REACH SVHC: Unknown; ComponentLink1URL: http://www.vishay.com/docs/20035/dcrcwe3.pdf; ComponentLink1Description: http://www.vishay.com/docs/20035/dcrcwe3.pdf; ComponentLink2URL: http://www.farnell.com/datasheets/2111203.pdf; ComponentLink2Description: http://www.farnell.com/datasheets/2111203.pdf; ComponentLink3URL: http://www.mouser.com/ds/2/427/dcrcwe3-109170.pdf; ComponentLink3Description: http://www.mouser.com/ds/2/427/dcrcwe3-109170.pdf; Stock 3: 49724; Pricing 3: 1=0.3, 10=0.258, 100=0.1008, 1000=0.04219, 2500=0.03868 (USD); ComponentLink4URL: http://datasheet.octopart.com/CRGCQ1210F120R-TE-Connectivity-datasheet-114679081.pdf; ComponentLink4Description: http://datasheet.octopart.com/CRGCQ1210F120R-TE-Connectivity-datasheet-114679081.pdf; ComponentLink5URL: http://sigma.octopart.com/114714153/technical_drawing/TE-Connectivity-CRGCQ1210F120R.pdf; ComponentLink5Description: http://sigma.octopart.com/114714153/technical_drawing/TE-Connectivity-CRGCQ1210F120R.pdf; .SCHCHK: USED; Supplier 1: Digi-Key; Supplier Part Number 1: RMCF1210FT120RDKR-ND
footprint R-1210
pins: 1, 2

## R-140K-0603
designator R?, comment 140K  Case Code (Imperial): 0603
RES SMD 140K OHM 1% 1/10W 0603; Manufacturer: Yageo; Manufacturer Part Number: RC0603FR-07140KL; Power Rating: 100mW; Resistance: 140kR; Voltage Rating: 50V; Temperature Coefficient: 100ppm/°C; .Creator: F:TALI; .PCBCHK: USED; Washability: OK; Supplier 1: Digi-Key; Stock 1: 1002992; Pricing 1: 1=0.1, 10=0.024, 100=0.0097, 1000=0.00437, 2500=0.00379 (USD); Case/Package: 0603; Case Code (Metric): 1608; Min Operating Temperature: -55°C; Max Operating Temperature: 155°C; Package Quantity: 1; Tolerance: 1%; Packaging: Tape and Reel; Termination: SMD/SMT; Composition: Thick Film; Number of Terminations: 2; Military Standard: Not; Max Power Dissipation: 100mW; Voltage Rating (DC): 50V; Features: Moisture Resistant; Length: 1.6mm; Height: 0.022inch; Width: 0.8mm; Depth: 0.8mm; Lead Free: Lead Free; ComponentLink1URL: http://www.yageo.com.tw/exep/pages/download/literatures/PYu-R_INT-thick_7.pdf; ComponentLink1Description: http://www.yageo.com.tw/exep/pages/download/literatures/PYu-R_INT-thick_7.pdf; ComponentLink2URL: http://www.yageo.com/documents/recent/PYu-RC_Group_51_RoHS_L_10.pdf; ComponentLink2Description: http://www.yageo.com/documents/recent/PYu-RC_Group_51_RoHS_L_10.pdf; Supplier Part Number 1: 311-140KHRDKR-ND; .SCHCHK: USED
pins: 1, 2

## R-150K-0603
designator R?, comment 150K  Case Code (Imperial): 0603
RES SMD 150K OHM 1/10W 0603; Manufacturer: Panasonic; Manufacturer Part Number: ERA-3AEB154V; Resistance: 150kR; Tolerance: 0.1%; Temperature Coefficient: 25ppm/°C; Power Rating: 100mW; Voltage Rating: 75V; .PCBCHK: USED; .Creator: F:TALI; Washability: OK; Stock 1: 274437; Pricing 1: 1=0.35, 10=0.3, 100=0.1172, 1000=0.04906, 2500=0.04498 (USD); Mount: Surface Mount; Case/Package: 0603; Number of Pins: 2; Contact Plating: Tin; Case Code (Metric): 1608; Min Operating Temperature: -55°C; Max Operating Temperature: 155°C; Composition: Metal Film,Thin Film; Packaging: Tape and Reel; Package Quantity: 1; Termination: SMD/SMT; Number of Terminations: 2; Military Standard: Not; Max Power Dissipation: 100mW; Voltage Rating (DC): 75V; Features: Automotive AEC-Q200; Length: 1.6mm; Height: 0.45mm; Width: 0.8mm; Depth: 0.8mm; Radiation Hardening: No; REACH SVHC: No SVHC; Lead Free: Lead Free; ComponentLink1URL: http://www.mouser.com/ds/2/315/AOA0000CE26-197354.pdf; ComponentLink1Description: http://www.mouser.com/ds/2/315/AOA0000CE26-197354.pdf; ComponentLink2URL: http://industrial.panasonic.com/www-data/pdf/AOA0000/AOA0000CE26.pdf; ComponentLink2Description: http://industrial.panasonic.com/www-data/pdf/AOA0000/AOA0000CE26.pdf; ComponentLink3URL: http://uk.rs-online.com/webdocs/0fe2/0900766b80fe20f7.pdf; ComponentLink3Description: http://uk.rs-online.com/webdocs/0fe2/0900766b80fe20f7.pdf; ComponentLink4URL: https://www.alliedelec.com/m/d/b6b0537e86f421aa7f5975bb1d8f429a.pdf; ComponentLink4Description: https://www.alliedelec.com/m/d/b6b0537e86f421aa7f5975bb1d8f429a.pdf; ComponentLink5URL: http://www.farnell.com/datasheets/485442.pdf; ComponentLink5Description: http://www.farnell.com/datasheets/485442.pdf; ComponentLink6URL: http://www.farnell.com/datasheets/2059650.pdf; ComponentLink6Description: http://www.farnell.com/datasheets/2059650.pdf; ComponentLink7URL: http://www.farnell.com/datasheets/2052875.pdf; ComponentLink7Description: http://www.farnell.com/datasheets/2052875.pdf; ComponentLink8URL: https://produktinfo.conrad.com/datenblaetter/450000-474999/451718-da-01-en-WIDERSTAND_0603_ERA.pdf; ComponentLink8Description: https://produktinfo.conrad.com/datenblaetter/450000-474999/451718-da-01-en-WIDERSTAND_0603_ERA.pdf; .SCHCHK: USED; Supplier 1: Digi-Key; Supplier Part Number 1: 311-150KGRDKR-ND
footprint R-0603
pins: 1, 2

## R-150R-0603
designator R?, comment 150R  Case Code (Imperial): 0603
RES SMD 150R 1/10W 5% 0603; Manufacturer: Yageo; Manufacturer Part Number: RC0603FR-07150RL; Tolerance: 1%; Temperature Coefficient: 100ppm/°C; Voltage Rating (DC): 50V; Power Rating: 100mW; .PCBCHK: USED; .Creator: F:TALI; Washability: OK; Stock 1: 4991405; Pricing 1: 1=0.1, 10=0.026, 100=0.0107, 1000=0.00478, 2500=0.00415 (USD); Case/Package: 0603; Number of Pins: 2; Case Code (Metric): 1608; Min Operating Temperature: -55°C; Max Operating Temperature: 155°C; Resistance: 150R; Packaging: Tape and Reel; Composition: Thick Film; Military Standard: Not; Package Quantity: 5000; Voltage Rating: 50V; Termination: SMD/SMT; Length: 1.6mm; Height: 0.45mm; Width: 0.8mm; Depth: 0.8mm; Lead Free: Lead Free; REACH SVHC: No SVHC; ComponentLink1URL: http://documents.rs-components.com/techlib://itc_doclist_GB.htm?stockno=5049612; ComponentLink1Description: http://documents.rs-components.com/techlib://itc_doclist_GB.htm?stockno=5049612; ComponentLink2URL: http://www.yageo.com/documents/recent/PYu-RC_Group_51_RoHS_L_9.pdf; ComponentLink2Description: http://www.yageo.com/documents/recent/PYu-RC_Group_51_RoHS_L_9.pdf; ComponentLink3URL: http://www.farnell.com/datasheets/443971.pdf; ComponentLink3Description: http://www.farnell.com/datasheets/443971.pdf; ComponentLink4URL: http://www.farnell.com/datasheets/1868787.pdf; ComponentLink4Description: http://www.farnell.com/datasheets/1868787.pdf; Stock 2: 1446455; Pricing 2: 1=0.1, 10=0.065, 100=0.0264, 1000=0.01186, 2500=0.01029 (USD); Mount: Surface Mount; Contact Plating: Tin; Number of Terminations: 2; Max Power Dissipation: 100mW; Features: Automotive AEC-Q200; Radiation Hardening: No; ComponentLink5URL: http://industrial.panasonic.com/www-data/pdf/AOA0000/AOA0000CE2.pdf; ComponentLink5Description: http://industrial.panasonic.com/www-data/pdf/AOA0000/AOA0000CE2.pdf; ComponentLink6URL: http://www.farnell.com/datasheets/1678782.pdf; ComponentLink6Description: http://www.farnell.com/datasheets/1678782.pdf; ComponentLink7URL: http://www.alliedelec.com/m/d/623f45ff1957d936ff56d46fd1c28cac.pdf; ComponentLink7Description: http://www.alliedelec.com/m/d/623f45ff1957d936ff56d46fd1c28cac.pdf; ComponentLink8URL: http://www.farnell.com/datasheets/1911175.pdf; ComponentLink8Description: http://www.farnell.com/datasheets/1911175.pdf; ComponentLink9URL: http://www.mouser.com/ds/2/315/AOA0000CE2-37512.pdf; ComponentLink9Description: http://www.mouser.com/ds/2/315/AOA0000CE2-37512.pdf; Stock 3: 32396; Pricing 3: 1=0.1, 10=0.021, 100=0.0086, 1000=0.00385, 2500=0.00334 (USD); Thickness: 457um; ComponentLink10URL: http://www.farnell.com/datasheets/691949.pdf; ComponentLink10Description: http://www.farnell.com/datasheets/691949.pdf; ComponentLink11URL: http://www.bourns.com/pdfs/chpreztr.pdf; ComponentLink11Description: http://www.bourns.com/pdfs/chpreztr.pdf; ComponentLink12URL: http://uk.rs-online.com/webdocs/0fcd/0900766b80fcdb72.pdf; ComponentLink12Description: http://uk.rs-online.com/webdocs/0fcd/0900766b80fcdb72.pdf; .SCHCHK: USED; Supplier 1: Digi-Key; Supplier Part Number 1: 311-150HRDKR-ND
footprint R-0603
pins: 1, 2

## R-150R-0603-%1
designator R?, comment 150R  Tolerance: 1%  Case/Package: 0603
RES SMD 150 OHM 1% 1/10W 0603; Manufacturer: Yageo; Manufacturer Part Number: RC0603FR-07150RL; Power Rating: 100mW; Voltage Rating (DC): 50V; Temperature Coefficient: 100ppm/°C; Washability: OK; .Creator: M.OZKAN; .PCBCHK: USED; Supplier 1: Digi-Key; Stock 1: 4506276; Pricing 1: 1=0.10000, 10=0.02400, 100=0.00970, 1000=0.00437, 2500=0.00379 (USD); RoHS: Yes; Number of Pins: 2; Case Code (Imperial): 0603; Case Code (Metric): 1608; Min Operating Temperature: -55°C; Max Operating Temperature: 155°C; Resistance: 150R; Packaging: Tape and Reel; Voltage Rating: 50V; Package Quantity: 5000; Termination: SMD/SMT; Composition: Thick Film; Military Standard: Not; Length: 1.6mm; Height: 0.45mm; Width: 0.8mm; Depth: 0.8mm; REACH SVHC: No SVHC; Lead Free: Lead Free; ComponentLink1URL: https://datasheet.ciiva.com/12555/rc0603-272842-12555301.pdf?src-supplier=Mouser; ComponentLink1Description: https://datasheet.ciiva.com/12555/rc0603-272842-12555301.pdf?src-supplier=Mouser; ComponentLink2URL: https://datasheet.ciiva.com/46412/443971-46412844.pdf?src-supplier=Element14; ComponentLink2Description: https://datasheet.ciiva.com/46412/443971-46412844.pdf?src-supplier=Element14; ComponentLink3URL: https://datasheet.ciiva.com/46440/1868787-46440893.pdf?src-supplier=Element14; ComponentLink3Description: https://datasheet.ciiva.com/46440/1868787-46440893.pdf?src-supplier=Element14; Supplier Part Number 1: 311-150HRCT-ND; .SCHCHK: USED
footprint R-0603
pins: 1, 2

## R-150R-0805
designator R?, comment 150R  Case Code (Imperial): 0805
RES SMD 150 OHM 1/8W 5% 0805; Manufacturer: Yageo; Manufacturer Part Number: RC0805JR-07150RL; Temperature Coefficient: 100ppm/°C; Power Rating: 125mW; Voltage Rating: 150V; .PCBCHK: USED; .Creator: F:TALI; Washability: OK; Stock 1: 0; Pricing 1: 1=0.1, 10=0.039, 100=0.0159, 1000=0.00716, 2500=0.00622 (USD); Case/Package: 0805; Contact Plating: Lead,Matte,Tin; Case Code (Metric): 2012; Min Operating Temperature: -55°C; Max Operating Temperature: 155°C; Resistance: 150R; Tolerance: 5%; Composition: Thick Film; Packaging: Tape and Reel; Termination: SMD/SMT; Radiation Hardening: No; REACH SVHC: Unknown; Lead Free: Lead Free; ComponentLink1URL: http://www.farnell.com/datasheets/444164.pdf; ComponentLink1Description: http://www.farnell.com/datasheets/444164.pdf; ComponentLink2URL: http://www.farnell.com/datasheets/442941.pdf; ComponentLink2Description: http://www.farnell.com/datasheets/442941.pdf; Stock 2: 468902; Pricing 2: 1=0.1, 10=0.081, 100=0.0311, 1000=0.01367, 2500=0.01181 (USD); Mount: Surface Mount; Number of Pins: 2; Military Standard: Not; Package Quantity: 1; Number of Terminations: 2; Max Power Dissipation: 125mW; Features: Automotive AEC-Q200; Voltage Rating (DC): 150V; Working Voltage: 150V; Length: 2mm; Height: 0.6mm; Depth: 1.25mm; Width: 0.049inch; ComponentLink3URL: http://www.farnell.com/datasheets/426256.pdf; ComponentLink3Description: http://www.farnell.com/datasheets/426256.pdf; ComponentLink4URL: https://www.alliedelec.com/m/d/623f45ff1957d936ff56d46fd1c28cac.pdf; ComponentLink4Description: https://www.alliedelec.com/m/d/623f45ff1957d936ff56d46fd1c28cac.pdf; ComponentLink5URL: http://www.farnell.com/datasheets/1678782.pdf; ComponentLink5Description: http://www.farnell.com/datasheets/1678782.pdf; ComponentLink6URL: http://industrial.panasonic.com/www-data/pdf/AOA0000/AOA0000CE2.pdf; ComponentLink6Description: http://industrial.panasonic.com/www-data/pdf/AOA0000/AOA0000CE2.pdf; ComponentLink7URL: http://www.mouser.com/ds/2/315/AOA0000C283-1093288.pdf; ComponentLink7Description: http://www.mouser.com/ds/2/315/AOA0000C283-1093288.pdf; Stock 3: 1127232; Pricing 3: 1=0.1, 10=0.061, 100=0.0249, 1000=0.0112, 2500=0.00972 (USD); ComponentLink8URL: http://industrial.panasonic.com/www-data/pdf/AOA0000/AOA0000CE1.pdf; ComponentLink8Description: http://industrial.panasonic.com/www-data/pdf/AOA0000/AOA0000CE1.pdf; ComponentLink9URL: https://www.alliedelec.com/m/d/51cd0790071e1666bdb9d00c57fcf960.pdf; ComponentLink9Description: https://www.alliedelec.com/m/d/51cd0790071e1666bdb9d00c57fcf960.pdf; ComponentLink10URL: http://www.farnell.com/datasheets/2371628.pdf; ComponentLink10Description: http://www.farnell.com/datasheets/2371628.pdf; ComponentLink11URL: http://www.farnell.com/datasheets/1500035.pdf; ComponentLink11Description: http://www.farnell.com/datasheets/1500035.pdf; .SCHCHK: USED; Supplier 1: Digi-Key; Supplier Part Number 1: 311-150ARDKR-ND
footprint R-0805
pins: 1, 2

## R-150R-1206
designator R?, comment 150R  Case Code (Imperial): 1206